# Altium footprint library xialeste-20221201.PcbLib: 195 footprints (part 4 of 13)
Each footprint in its own frame and in the unit in brackets; x right, y up, seen from the top. Pads: shape width x height; smd on the part's side, far side on the other; paste and mask are expansions set on the pad; w line width, h text height; cw(c..) or ccw(c..) is an arc to the next point about the centre after c.
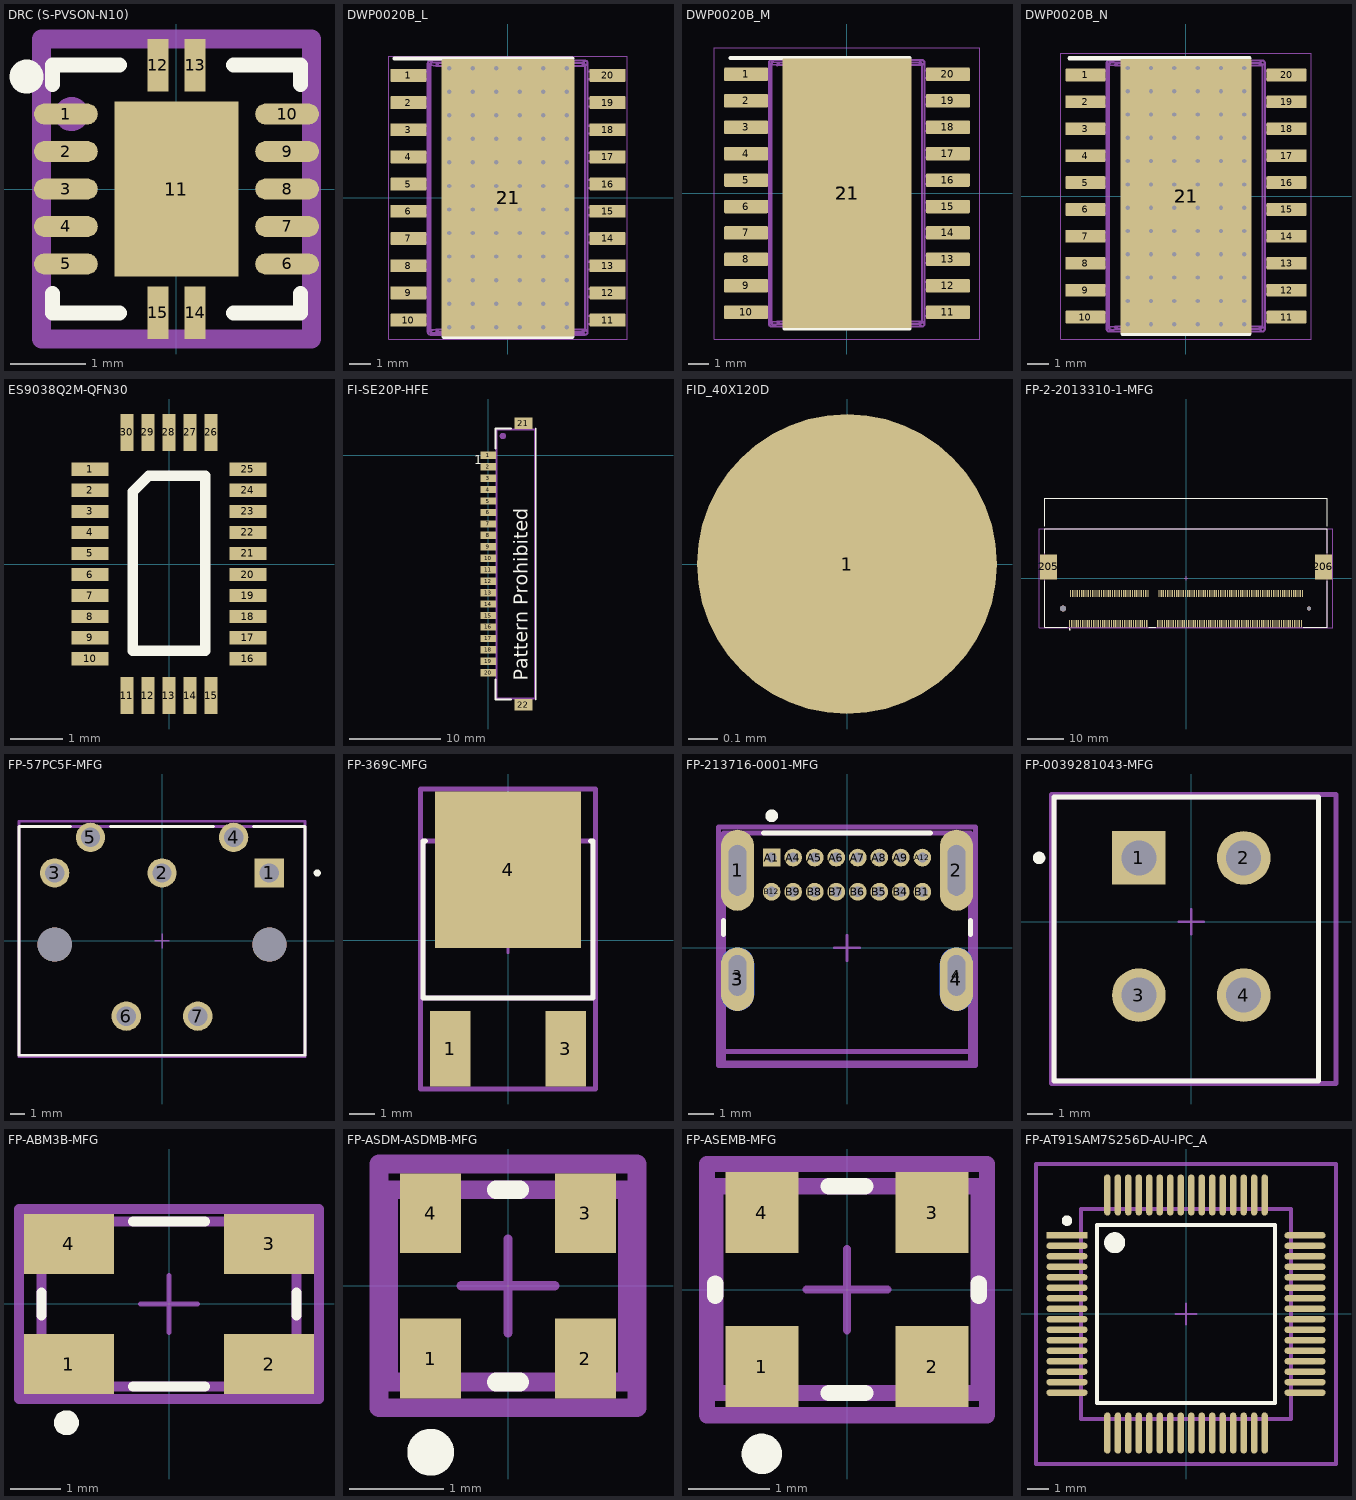
[diagram p3: the footprints below, top view; thin cyan lines are the x and y axes]

## DRC (S-PVSON-N10) [mm] "Creator MM"
pads (15):
  oval 0.85x0.28 smd mask+0.025: 1(-1.475,1) 2(-1.475,0.5) 3(-1.475,0) 4(-1.475,-0.5) 5(-1.475,-1) 6(1.475,-1) 7(1.475,-0.5) 8(1.475,0) 9(1.475,0.5) 10(1.475,1)
  rect 1.65x2.337 smd paste-1.524 mask+0.025: 11(0,0)
  rect 0.28x0.7 smd mask+0.127: 12(-0.25,1.651) 13(0.25,1.651) 14(0.25,-1.651) 15(-0.25,-1.651)
Top Overlay:
  circle w0.254: c-2,1.5 r0.1
  lines w0.2: -1.651,-1.397 -1.651,-1.651 -0.762,-1.651 ; -1.651,1.397 -1.651,1.651 -0.762,1.651 ; 0.762,-1.651 1.651,-1.651 1.651,-1.397 ; 0.762,1.651 1.651,1.651 1.651,1.397
Top Paste:
  rectangle: -0.762,0.101 -0.102,1.142
  rectangle: -0.762,-1.144 -0.102,-0.102
  rectangle: 0.101,-1.144 0.762,-0.102
  rectangle: 0.101,0.101 0.762,1.142
Mechanical 29:
  circle w0.254: c-1.4,1 r0.1
  lines w0.254: -1.8,-2 1.8,-2 1.8,2 -1.8,2 -1.8,-2
  text ".Designator" at 0.55,-0.9 h1
3D body: height 1, standoff 0, extent -1.651,-1.651 1.651,1.651

## DWP0020B_L [mm] "SOP, 20-Leads, Body 13x7.6mm, Pitch 1.27mm, Thermal Pad 2.79x3.81mm, IPC High Density"
height 2.65
pads (23):
  rrect17% 1.7x0.6 smd: 1(-4.65,5.715) 2(-4.65,4.445) 3(-4.65,3.175) 4(-4.65,1.905) 5(-4.65,0.635) 6(-4.65,-0.635) 7(-4.65,-1.905) 8(-4.65,-3.175) 9(-4.65,-4.445) 10(-4.65,-5.715) 11(4.65,-5.715) 12(4.65,-4.445) 13(4.65,-3.175) 14(4.65,-1.905) 15(4.65,-0.635) 16(4.65,0.635) 17(4.65,1.905) 18(4.65,3.175) 19(4.65,4.445) 20(4.65,5.715)
  rrect2% 6.2x12.95 smd paste-3.1 mask-3.1: 21(0,0)
  rrect4% 2.79x3.81 on Top Paste: 21(0,0)
  rrect4% 2.79x3.81 on Top Solder: 21(0,0)
via 2.75,-0.55 diameter 0.5 hole 0.2
via 1.65,-0.55 diameter 0.5 hole 0.2
via 0.55,-0.55 diameter 0.5 hole 0.2
via 0.55,-1.65 diameter 0.5 hole 0.2
via 1.65,-1.65 diameter 0.5 hole 0.2
via 2.75,-1.65 diameter 0.5 hole 0.2
via 0.55,-2.75 diameter 0.5 hole 0.2
via 1.65,-2.75 diameter 0.5 hole 0.2
via 2.75,-2.75 diameter 0.5 hole 0.2
via 0.55,-3.85 diameter 0.5 hole 0.2
via 1.65,-3.85 diameter 0.5 hole 0.2
via 2.75,-3.85 diameter 0.5 hole 0.2
via 0.55,-4.95 diameter 0.5 hole 0.2
via 1.65,-4.95 diameter 0.5 hole 0.2
via 2.75,-4.95 diameter 0.5 hole 0.2
via 0.55,-6.05 diameter 0.5 hole 0.2
via 1.65,-6.05 diameter 0.5 hole 0.2
via 2.75,-6.05 diameter 0.5 hole 0.2
via -2.75,-0.55 diameter 0.5 hole 0.2
via -1.65,-0.55 diameter 0.5 hole 0.2
via -0.55,-0.55 diameter 0.5 hole 0.2
via -0.55,-1.65 diameter 0.5 hole 0.2
via -1.65,-1.65 diameter 0.5 hole 0.2
via -2.75,-1.65 diameter 0.5 hole 0.2
via -0.55,-2.75 diameter 0.5 hole 0.2
via -1.65,-2.75 diameter 0.5 hole 0.2
via -2.75,-2.75 diameter 0.5 hole 0.2
via -0.55,-3.85 diameter 0.5 hole 0.2
via -1.65,-3.85 diameter 0.5 hole 0.2
via -2.75,-3.85 diameter 0.5 hole 0.2
via -0.55,-4.95 diameter 0.5 hole 0.2
via -1.65,-4.95 diameter 0.5 hole 0.2
via -2.75,-4.95 diameter 0.5 hole 0.2
via -0.55,-6.05 diameter 0.5 hole 0.2
via -1.65,-6.05 diameter 0.5 hole 0.2
via -2.75,-6.05 diameter 0.5 hole 0.2
via -2.75,0.55 diameter 0.5 hole 0.2
via -1.65,0.55 diameter 0.5 hole 0.2
via -0.55,0.55 diameter 0.5 hole 0.2
via -0.55,1.65 diameter 0.5 hole 0.2
via -1.65,1.65 diameter 0.5 hole 0.2
via -2.75,1.65 diameter 0.5 hole 0.2
via -0.55,2.75 diameter 0.5 hole 0.2
via -1.65,2.75 diameter 0.5 hole 0.2
via -2.75,2.75 diameter 0.5 hole 0.2
via -0.55,3.85 diameter 0.5 hole 0.2
via -1.65,3.85 diameter 0.5 hole 0.2
via -2.75,3.85 diameter 0.5 hole 0.2
via -0.55,4.95 diameter 0.5 hole 0.2
via -1.65,4.95 diameter 0.5 hole 0.2
via -2.75,4.95 diameter 0.5 hole 0.2
via -0.55,6.05 diameter 0.5 hole 0.2
via -1.65,6.05 diameter 0.5 hole 0.2
via -2.75,6.05 diameter 0.5 hole 0.2
via 2.75,6.05 diameter 0.5 hole 0.2
via 1.65,6.05 diameter 0.5 hole 0.2
via 0.55,6.05 diameter 0.5 hole 0.2
via 2.75,4.95 diameter 0.5 hole 0.2
via 1.65,4.95 diameter 0.5 hole 0.2
via 0.55,4.95 diameter 0.5 hole 0.2
via 2.75,3.85 diameter 0.5 hole 0.2
via 1.65,3.85 diameter 0.5 hole 0.2
via 0.55,3.85 diameter 0.5 hole 0.2
via 2.75,2.75 diameter 0.5 hole 0.2
via 1.65,2.75 diameter 0.5 hole 0.2
via 0.55,2.75 diameter 0.5 hole 0.2
via 2.75,1.65 diameter 0.5 hole 0.2
via 1.65,1.65 diameter 0.5 hole 0.2
via 0.55,1.65 diameter 0.5 hole 0.2
via 0.55,0.55 diameter 0.5 hole 0.2
via 1.65,0.55 diameter 0.5 hole 0.2
via 2.75,0.55 diameter 0.5 hole 0.2
Top Overlay:
  lines w0.2: -5.3,6.5 3,6.5 ; -3,-6.5 3,-6.5
Mechanical 1:
  text ".Designator" at -1.854,-0.508 h1.02
Top Assembly:
  drawing of 634 lines, arcs and shapes, not listed
Mechanical 15:
  lines w0.05: -5.575,-6.6 -5.575,6.6 5.575,6.6 5.575,-6.6 -5.575,-6.6
  lines w0.1: -0.5,0 0.5,0 -0.5,0 ; 0,-0.5 0,0.5 0,-0.5
3D body "DWP0020B.stp": height 2.65, standoff 0, extent -5.216,-6.412 5.216,6.413

## DWP0020B_M [mm] "SOP, 20-Leads, Body 13x7.6mm, Pitch 1.27mm, Thermal Pad 2.79x3.81mm, IPC Low Density"
height 2.65
pads (23):
  rrect15% 2.1x0.65 smd: 1(-4.85,5.715) 2(-4.85,4.445) 3(-4.85,3.175) 4(-4.85,1.905) 5(-4.85,0.635) 6(-4.85,-0.635) 7(-4.85,-1.905) 8(-4.85,-3.175) 9(-4.85,-4.445) 10(-4.85,-5.715) 11(4.85,-5.715) 12(4.85,-4.445) 13(4.85,-3.175) 14(4.85,-1.905) 15(4.85,-0.635) 16(4.85,0.635) 17(4.85,1.905) 18(4.85,3.175) 19(4.85,4.445) 20(4.85,5.715)
  rrect2% 6.2x12.95 smd paste-3.1 mask-3.1: 21(0,0)
  rrect4% 2.79x3.81 on Top Paste: 21(0,0)
  rrect4% 2.79x3.81 on Top Solder: 21(0,0)
Top Overlay:
  lines w0.2: -5.6,6.5 3,6.5 ; -3,-6.5 3,-6.5
Mechanical 1:
  text ".Designator" at -1.854,-0.508 h1.02
Top Assembly:
  drawing of 634 lines, arcs and shapes, not listed
Mechanical 15:
  lines w0.05: -6.375,-7 6.375,-7 6.375,7 -6.375,7 -6.375,-7
  lines w0.1: -0.5,0 0.5,0 -0.5,0 ; 0,-0.5 0,0.5 0,-0.5
3D body "DWP0020B.stp": height 2.65, standoff 0, extent -5.216,-6.412 5.216,6.413

## DWP0020B_N [mm] "SOP, 20-Leads, Body 13x7.6mm, Pitch 1.27mm, Thermal Pad 2.79x3.81mm, IPC Medium Density"
height 2.65
pads (23):
  rrect17% 1.9x0.6 smd: 1(-4.75,5.715) 2(-4.75,4.445) 3(-4.75,3.175) 4(-4.75,1.905) 5(-4.75,0.635) 6(-4.75,-0.635) 7(-4.75,-1.905) 8(-4.75,-3.175) 9(-4.75,-4.445) 10(-4.75,-5.715) 11(4.75,-5.715) 12(4.75,-4.445) 13(4.75,-3.175) 14(4.75,-1.905) 15(4.75,-0.635) 16(4.75,0.635) 17(4.75,1.905) 18(4.75,3.175) 19(4.75,4.445) 20(4.75,5.715)
  rrect2% 6.2x12.95 smd paste-3.1 mask-3.1: 21(0,0)
  rrect4% 2.79x3.81 on Top Paste: 21(0,0)
  rrect4% 2.79x3.81 on Top Solder: 21(0,0)
via 2.75,0.55 diameter 0.5 hole 0.2
via 1.65,0.55 diameter 0.5 hole 0.2
via 0.55,0.55 diameter 0.5 hole 0.2
via 0.55,1.65 diameter 0.5 hole 0.2
via 1.65,1.65 diameter 0.5 hole 0.2
via 2.75,1.65 diameter 0.5 hole 0.2
via 0.55,2.75 diameter 0.5 hole 0.2
via 1.65,2.75 diameter 0.5 hole 0.2
via 2.75,2.75 diameter 0.5 hole 0.2
via 0.55,3.85 diameter 0.5 hole 0.2
via 1.65,3.85 diameter 0.5 hole 0.2
via 2.75,3.85 diameter 0.5 hole 0.2
via 0.55,4.95 diameter 0.5 hole 0.2
via 1.65,4.95 diameter 0.5 hole 0.2
via 2.75,4.95 diameter 0.5 hole 0.2
via 0.55,6.05 diameter 0.5 hole 0.2
via 1.65,6.05 diameter 0.5 hole 0.2
via 2.75,6.05 diameter 0.5 hole 0.2
via -2.75,6.05 diameter 0.5 hole 0.2
via -1.65,6.05 diameter 0.5 hole 0.2
via -0.55,6.05 diameter 0.5 hole 0.2
via -2.75,4.95 diameter 0.5 hole 0.2
via -1.65,4.95 diameter 0.5 hole 0.2
via -0.55,4.95 diameter 0.5 hole 0.2
via -2.75,3.85 diameter 0.5 hole 0.2
via -1.65,3.85 diameter 0.5 hole 0.2
via -0.55,3.85 diameter 0.5 hole 0.2
via -2.75,2.75 diameter 0.5 hole 0.2
via -1.65,2.75 diameter 0.5 hole 0.2
via -0.55,2.75 diameter 0.5 hole 0.2
via -2.75,1.65 diameter 0.5 hole 0.2
via -1.65,1.65 diameter 0.5 hole 0.2
via -0.55,1.65 diameter 0.5 hole 0.2
via -0.55,0.55 diameter 0.5 hole 0.2
via -1.65,0.55 diameter 0.5 hole 0.2
via -2.75,0.55 diameter 0.5 hole 0.2
via -2.75,-6.05 diameter 0.5 hole 0.2
via -1.65,-6.05 diameter 0.5 hole 0.2
via -0.55,-6.05 diameter 0.5 hole 0.2
via -2.75,-4.95 diameter 0.5 hole 0.2
via -1.65,-4.95 diameter 0.5 hole 0.2
via -0.55,-4.95 diameter 0.5 hole 0.2
via -2.75,-3.85 diameter 0.5 hole 0.2
via -1.65,-3.85 diameter 0.5 hole 0.2
via -0.55,-3.85 diameter 0.5 hole 0.2
via -2.75,-2.75 diameter 0.5 hole 0.2
via -1.65,-2.75 diameter 0.5 hole 0.2
via -0.55,-2.75 diameter 0.5 hole 0.2
via -2.75,-1.65 diameter 0.5 hole 0.2
via -1.65,-1.65 diameter 0.5 hole 0.2
via -0.55,-1.65 diameter 0.5 hole 0.2
via -0.55,-0.55 diameter 0.5 hole 0.2
via -1.65,-0.55 diameter 0.5 hole 0.2
via -2.75,-0.55 diameter 0.5 hole 0.2
via 2.75,-6.05 diameter 0.5 hole 0.2
via 1.65,-6.05 diameter 0.5 hole 0.2
via 0.55,-6.05 diameter 0.5 hole 0.2
via 2.75,-4.95 diameter 0.5 hole 0.2
via 1.65,-4.95 diameter 0.5 hole 0.2
via 0.55,-4.95 diameter 0.5 hole 0.2
via 2.75,-3.85 diameter 0.5 hole 0.2
via 1.65,-3.85 diameter 0.5 hole 0.2
via 0.55,-3.85 diameter 0.5 hole 0.2
via 2.75,-2.75 diameter 0.5 hole 0.2
via 1.65,-2.75 diameter 0.5 hole 0.2
via 0.55,-2.75 diameter 0.5 hole 0.2
via 2.75,-1.65 diameter 0.5 hole 0.2
via 1.65,-1.65 diameter 0.5 hole 0.2
via 0.55,-1.65 diameter 0.5 hole 0.2
via 0.55,-0.55 diameter 0.5 hole 0.2
via 1.65,-0.55 diameter 0.5 hole 0.2
via 2.75,-0.55 diameter 0.5 hole 0.2
Top Overlay:
  lines w0.2: -5.5,6.5 3,6.5 ; -3,-6.5 3,-6.5
Mechanical 1:
  text ".Designator" at -1.854,-0.508 h1.02
Top Assembly:
  drawing of 634 lines, arcs and shapes, not listed
Mechanical 15:
  lines w0.05: -5.925,-6.75 5.925,-6.75 5.925,6.75 -5.925,6.75 -5.925,-6.75
  lines w0.1: -0.5,0 0.5,0 -0.5,0 ; 0,-0.5 0,0.5 0,-0.5
3D body "DWP0020B.stp": height 2.65, standoff 0, extent -5.216,-6.412 5.216,6.413

## ES9038Q2M-QFN30 [mm]
pads (30):
  rect 0.7x0.25 smd: 1(-1.5,1.8) 2(-1.5,1.4) 3(-1.5,1) 4(-1.5,0.6) 5(-1.5,0.2) 6(-1.5,-0.2) 7(-1.5,-0.6) 8(-1.5,-1) 9(-1.5,-1.4) 10(-1.5,-1.8) 16(1.5,-1.8) 17(1.5,-1.4) 18(1.5,-1) 19(1.5,-0.6) 20(1.5,-0.2) 21(1.5,0.2) 22(1.5,0.6) 23(1.5,1) 24(1.5,1.4) 25(1.5,1.8)
  rect 0.25x0.7 smd: 11(-0.8,-2.5) 12(-0.4,-2.5) 13(0,-2.5) 14(0.4,-2.5) 15(0.8,-2.5) 26(0.8,2.5) 27(0.4,2.5) 28(0,2.5) 29(-0.4,2.5) 30(-0.8,2.5)
Top Overlay:
  lines w0.2: -0.686,-1.651 0.686,-1.651 0.686,1.676 -0.384,1.676 -0.686,1.375 -0.686,-1.651

## FI-SE20P-HFE [mm] "Creator MM"
height 1.96
pads (22):
  rect 1.7x0.8 smd: 1(0,0) 2(0,-1.25) 3(0,-2.5) 4(0,-3.75) 5(0,-5) 6(0,-6.25) 7(0,-7.5) 8(0,-8.75) 9(0,-10) 10(0,-11.25) 11(0,-12.5) 12(0,-13.75) 13(0,-15) 14(0,-16.25) 15(0,-17.5) 16(0,-18.75) 17(0,-20) 18(0,-21.25) 19(0,-22.5) 20(0,-23.75)
  rect 2x1.25 smd: 21(3.85,3.5) 22(3.85,-27.25)
Top Overlay:
  lines w0.2: 0.8,-24.45 0.8,-26.65 2.5,-26.65 ; 0.8,0.7 0.8,2.9 2.5,2.9 ; 5.2,-26.65 5.2,2.9
  text "Pattern Prohibited" at 4.3,-24.6 h1.52
  text "1" at -1.5,-1 h1.02
Mechanical 29:
  circle w0.5: c1.6,2.1 r0.1
  lines w0.2: 0.9,-26.55 5.1,-26.55 5.1,2.8 0.9,2.8 0.9,-26.55
  text ".Designator" at 2.2,-10.5 h1.52
3D body "K3D-FI-SE20P-HFE-R1.STEP": height 2.11, standoff 0, extent -0.25,-27.275 5.1,3.475

## FID_40X120D [mil]
pads (1):
  round 40 smd paste-40 mask+40: 1(0,0)

## FP-2-2013310-1-MFG [mm]
pads (208):
  rect 0.35x2 smd paste+0 mask+0: 1(-31.65,-12.35) 2(-31.35,-4.15) 3(-31.05,-12.35) 4(-30.75,-4.15) 5(-30.45,-12.35) 6(-30.15,-4.15) 7(-29.85,-12.35) 8(-29.55,-4.15) 9(-29.25,-12.35) 10(-28.95,-4.15) 11(-28.65,-12.35) 12(-28.35,-4.15) 13(-28.05,-12.35) 14(-27.75,-4.15) 15(-27.45,-12.35) 16(-27.15,-4.15) 17(-26.85,-12.35) 18(-26.55,-4.15) 19(-26.25,-12.35) 20(-25.95,-4.15) 21(-25.65,-12.35) 22(-25.35,-4.15) 23(-25.05,-12.35) 24(-24.75,-4.15) 25(-24.45,-12.35) 26(-24.15,-4.15) 27(-23.85,-12.35) 28(-23.55,-4.15) 29(-23.25,-12.35) 30(-22.95,-4.15) 31(-22.65,-12.35) 32(-22.35,-4.15) 33(-22.05,-12.35) 34(-21.75,-4.15) 35(-21.45,-12.35) 36(-21.15,-4.15) 37(-20.85,-12.35) 38(-20.55,-4.15) 39(-20.25,-12.35) 40(-19.95,-4.15) 41(-19.65,-12.35) 42(-19.35,-4.15) 43(-19.05,-12.35) 44(-18.75,-4.15) 45(-18.45,-12.35) 46(-18.15,-4.15) 47(-17.85,-12.35) 48(-17.55,-4.15) 49(-17.25,-12.35) 50(-16.95,-4.15) 51(-16.65,-12.35) 52(-16.35,-4.15) 53(-16.05,-12.35) 54(-15.75,-4.15) 55(-15.45,-12.35) 56(-15.15,-4.15) 57(-14.85,-12.35) 58(-14.55,-4.15) 59(-14.25,-12.35) 60(-13.95,-4.15) 61(-13.65,-12.35) 62(-13.35,-4.15) 63(-13.05,-12.35) 64(-12.75,-4.15) 65(-12.45,-12.35) 66(-12.15,-4.15) 67(-11.85,-12.35) 68(-11.55,-4.15) 69(-11.25,-12.35) 70(-10.95,-4.15) 71(-10.65,-12.35) 72(-10.35,-4.15) 73(-7.65,-12.35) 74(-7.35,-4.15) 75(-7.05,-12.35) 76(-6.75,-4.15) 77(-6.45,-12.35) 78(-6.15,-4.15) 79(-5.85,-12.35) 80(-5.55,-4.15) 81(-5.25,-12.35) 82(-4.95,-4.15) 83(-4.65,-12.35) 84(-4.35,-4.15) 85(-4.05,-12.35) 86(-3.75,-4.15) 87(-3.45,-12.35) 88(-3.15,-4.15) 89(-2.85,-12.35) 90(-2.55,-4.15) 91(-2.25,-12.35) 92(-1.95,-4.15) 93(-1.65,-12.35) 94(-1.35,-4.15) 95(-1.05,-12.35) 96(-0.75,-4.15) 97(-0.45,-12.35) 98(-0.15,-4.15) 99(0.15,-12.35) 100(0.45,-4.15) 101(0.75,-12.35) 102(1.05,-4.15) 103(1.35,-12.35) 104(1.65,-4.15) 105(1.95,-12.35) 106(2.25,-4.15) 107(2.55,-12.35) 108(2.85,-4.15) 109(3.15,-12.35) 110(3.45,-4.15) 111(3.75,-12.35) 112(4.05,-4.15) 113(4.35,-12.35) 114(4.65,-4.15) 115(4.95,-12.35) 116(5.25,-4.15) 117(5.55,-12.35) 118(5.85,-4.15) 119(6.15,-12.35) 120(6.45,-4.15) 121(6.75,-12.35) 122(7.05,-4.15) 123(7.35,-12.35) 124(7.65,-4.15) 125(7.95,-12.35) 126(8.25,-4.15) 127(8.55,-12.35) 128(8.85,-4.15) 129(9.15,-12.35) 130(9.45,-4.15) 131(9.75,-12.35) 132(10.05,-4.15) 133(10.35,-12.35) 134(10.65,-4.15) 135(10.95,-12.35) 136(11.25,-4.15) 137(11.55,-12.35) 138(11.85,-4.15) 139(12.15,-12.35) 140(12.45,-4.15) 141(12.75,-12.35) 142(13.05,-4.15) 143(13.35,-12.35) 144(13.65,-4.15) 145(13.95,-12.35) 146(14.25,-4.15) 147(14.55,-12.35) 148(14.85,-4.15) 149(15.15,-12.35) 150(15.45,-4.15) 151(15.75,-12.35) 152(16.05,-4.15) 153(16.35,-12.35) 154(16.65,-4.15) 155(16.95,-12.35) 156(17.25,-4.15) 157(17.55,-12.35) 158(17.85,-4.15) 159(18.15,-12.35) 160(18.45,-4.15) 161(18.75,-12.35) 162(19.05,-4.15) 163(19.35,-12.35) 164(19.65,-4.15) 165(19.95,-12.35) 166(20.25,-4.15) 167(20.55,-12.35) 168(20.85,-4.15) 169(21.15,-12.35) 170(21.45,-4.15) 171(21.75,-12.35) 172(22.05,-4.15) 173(22.35,-12.35) 174(22.65,-4.15) 175(22.95,-12.35) 176(23.25,-4.15) 177(23.55,-12.35) 178(23.85,-4.15) 179(24.15,-12.35) 180(24.45,-4.15) 181(24.75,-12.35) 182(25.05,-4.15) 183(25.35,-12.35) 184(25.65,-4.15) 185(25.95,-12.35) 186(26.25,-4.15) 187(26.55,-12.35) 188(26.85,-4.15) 189(27.15,-12.35) 190(27.45,-4.15) 191(27.75,-12.35) 192(28.05,-4.15) 193(28.35,-12.35) 194(28.65,-4.15) 195(28.95,-12.35) 196(29.25,-4.15) 197(29.55,-12.35) 198(29.85,-4.15) 199(30.15,-12.35) 200(30.45,-4.15) 201(30.75,-12.35) 202(31.05,-4.15) 203(31.35,-12.35) 204(31.65,-4.15)
  rect 4.7x6.8 smd paste+0 mask+0: 205(-37.35,3.05) 206(37.35,3.05)
  round 1.6 hole 1.6 unplated paste-1000 mask+0: ""(-33.4,-8.25)
  round 1.1 hole 1.1 unplated paste-1000 mask+0: ""(33.4,-8.25)
Top Overlay:
  circle w0.25: c-31.625,-13.925 r0.125
  lines w0.2: -38.4,-0.725 -38.4,-13.375 -32.2,-13.375 ; -38.4,6.825 -38.4,13.375 38.4,13.375 38.4,6.825 ; -38.4,14.143 -38.4,21.75 38.4,21.75 38.4,14.143 ; -10.1,-13.375 -8.2,-13.375 ; 31.9,-13.375 38.4,-13.375 38.4,-0.725
Top 3D Body:
  lines w0.2: -38.4,-13.375 -38.4,13.375 38.4,13.375 38.4,-13.375 -38.4,-13.375
Top Courtyard:
  lines w0.2: -39.8,-13.475 -39.8,13.475 39.8,13.475 39.8,-13.475 -39.8,-13.475
Top Assembly:
  lines w0.2: -39.8,-13.475 -39.8,13.475 39.8,13.475 39.8,-13.475 -39.8,-13.475
  text ".Designator" at 0,0.187 h1
Top Component Center:
  lines w0.1: -0.5,0 0.5,0 ; 0,-0.5 0,0.5
3D body "Conn_TE_Connectivity_2-2013310-1_eec.STEP": height 0.25, standoff 0, extent -39.8,-13.475 39.8,13.475

## FP-57PC5F-MFG [mm]
pads (9):
  rect 2.05x2.05 hole 1.35 paste-1000 mask+0: 1(7.505,4.75)
  round 2.05 hole 1.35 paste-1000 mask+0: 2(0,4.75) 3(-7.505,4.75) 4(5.005,7.24) 5(-5.005,7.24) 6(-2.5,-5.26) 7(2.5,-5.26)
  round 2.39 hole 2.39 unplated paste-1000 mask+0: ""(-7.505,-0.26) ""(7.505,-0.26)
Top Overlay:
  circle w0.25: c10.85,4.75 r0.125
  lines w0.2: -6.405,8 -10,8 -10,-8 10,-8 10,8 6.405,8 ; -3.605,8 3.605,8
Top 3D Body:
  lines w0.2: -10,-8 -10,8 10,8 10,-8 -10,-8
Top Courtyard:
  lines w0.2: -10,-8.1 -10,8.365 10,8.365 10,-8.1 -10,-8.1
Top Assembly:
  lines w0.2: -10,-8.1 -10,8.365 10,8.365 10,-8.1 -10,-8.1
  text ".Designator" at 0,0.32 h1
Top Component Center:
  lines w0.1: -0.5,0 0.5,0 ; 0,-0.5 0,0.5
3D body "Conn_Switchcraft_57PC5F_eec.STEP": height 0.25, standoff 0, extent -10.35,-8.1 10.35,8.365

## FP-369C-MFG [mm]
pads (3):
  rect 1.6x3 smd paste+0 mask+0: 1(-2.285,-4.3) 3(2.285,-4.3)
  rect 5.8x6.2 smd paste+0 mask+0: 4(0,2.79)
Top Overlay:
  lines w0.2: -3.275,3.935 -3.365,3.935 -3.365,-2.285 3.365,-2.285 3.365,3.935 3.275,3.935
Top 3D Body:
  lines w0.2: -3.365,-2.285 3.365,-2.285 3.365,3.935 -3.365,3.935 -3.365,-2.285
Top Courtyard:
  lines w0.2: -3.465,-5.9 3.465,-5.9 3.465,5.99 -3.465,5.99 -3.465,-5.9
Top Assembly:
  lines w0.2: -3.465,-5.9 3.465,-5.9 3.465,5.99 -3.465,5.99 -3.465,-5.9
  text ".Designator" at 0,0.044 h1
Top Component Center:
  lines w0.1: -0.5,0 0.5,0 ; 0,-0.5 0,0.5
3D body "IC_ON_Semiconductor_MC7805CDTG_eec.STEP": height 0.25, standoff 0, extent -3.465,-5.9 3.465,5.99

## FP-213716-0001-MFG [mm]
pads (24):
  rrect100% 1.3x3.2 hole 2 slot 0.7 at 0 deg paste-1000 mask+0: 1(-4.32,3.065) 2(4.32,3.065)
  rrect100% 1.3x2.5 smd paste-1000 mask+0: 3(-4.32,-1.235) 4(4.32,-1.235)
  rrect100% 1.3x2.5 smd far side paste-1000 mask+0: 3(-4.32,-1.235) 4(4.32,-1.235)
  rrect100% 0.7x1.6 hole 1.6 slot 0.7 at 0 deg paste-1000 mask+0: 3(-4.32,-1.085) 4(4.32,-1.085)
  rect 0.7x0.7 hole 0.4 paste-1000 mask+0: A1(-2.975,3.565)
  round 0.7 hole 0.4 paste-1000 mask+0: A4(-2.125,3.565) A5(-1.275,3.565) A6(-0.425,3.565) A7(0.425,3.565) A8(1.275,3.565) A9(2.125,3.565) A12(2.975,3.565) B1(2.975,2.215) B4(2.125,2.215) B5(1.275,2.215) B6(0.425,2.215) B7(-0.425,2.215) B8(-1.275,2.215) B9(-2.125,2.215) B12(-2.975,2.215)
Top Overlay:
  circle w0.25: c-2.975,5.215 r0.125
  lines w0.2: -4.87,0.54 -4.87,1.09 ; -3.295,4.535 3.295,4.535 ; 4.87,0.54 4.87,1.09
Top 3D Body:
  lines w0.2: -5.07,-4.085 5.07,-4.085 ; -4.87,-4.535 -4.87,4.535 4.87,4.535 4.87,-4.535 -4.87,-4.535
Top Courtyard:
  lines w0.2: -5.07,-4.635 -5.07,4.765 5.07,4.765 5.07,-4.635 -5.07,-4.635
Top Assembly:
  lines w0.2: -5.07,-4.635 -5.07,4.765 5.07,4.765 5.07,-4.635 -5.07,-4.635
  text ".Designator" at 0,0.252 h1
Top Component Center:
  lines w0.1: -0.5,0 0.5,0 ; 0,-0.5 0,0.5
3D body "Conn_Molex_213716-0001_eec.STEP": height 0.25, standoff 0, extent -5.07,-4.635 5.07,4.765

## FP-0039281043-MFG [mm]
pads (4):
  rect 2.15x2.15 hole 1.4 paste-1000 mask+0: 1(-2.1,2.55)
  round 2.15 hole 1.4 paste-1000 mask+0: 2(2.1,2.55) 3(-2.1,-2.95) 4(2.1,-2.95)
Top Overlay:
  circle w0.25: c-6.1,2.55 r0.125
  lines w0.2: -5.5,-6.4 5.1,-6.4 5.1,5 -5.5,5 -5.5,-6.4
Top 3D Body:
  lines w0.2: -5.5,-6.4 5.1,-6.4 5.1,5 -5.5,5 -5.5,-6.4
Top Courtyard:
  lines w0.2: -5.6,-6.5 5.8,-6.5 5.8,5.1 -5.6,5.1 -5.6,-6.5
Top Assembly:
  lines w0.2: -5.6,-6.5 5.8,-6.5 5.8,5.1 -5.6,5.1 -5.6,-6.5
  text ".Designator" at 0.1,-0.513 h1
Top Component Center:
  lines w0.1: -0.5,0 0.5,0 ; 0,-0.5 0,0.5
3D body "Conn_Molex_0039281043_eec.STEP": height 0.25, standoff 0, extent -5.6,-6.5 5.8,5.1

## FP-ABM3B-MFG [mm]
pads (4):
  rect 1.8x1.2 smd paste+0 mask+0: 1(-2,-1.2) 2(2,-1.2) 3(2,1.2) 4(-2,1.2)
Top Overlay:
  circle w0.25: c-2.05,-2.375 r0.125
  lines w0.2: -2.55,-0.225 -2.55,0.225 ; -0.725,-1.65 0.725,-1.65 ; -0.725,1.65 0.725,1.65 ; 2.55,-0.225 2.55,0.225
Top 3D Body:
  lines w0.2: -2.55,-1.65 2.55,-1.65 2.55,1.65 -2.55,1.65 -2.55,-1.65
Top Courtyard:
  lines w0.2: -3,-1.9 3,-1.9 3,1.9 -3,1.9 -3,-1.9
Top Assembly:
  lines w0.2: -3,-1.9 3,-1.9 3,1.9 -3,1.9 -3,-1.9
  text ".Designator" at 0,0.187 h1
Top Component Center:
  lines w0.1: -0.57,0 0.57,0 ; 0,-0.57 0,0.57
3D body "Crys_Abracon_ABM3B-12_000MHZ-10-B-1-U-T_eec.STEP": height 0.25, standoff 0, extent -3,-1.9 3,1.9

## FP-ASDM-ASDMB-MFG [mm]
pads (4):
  rect 0.65x0.85 smd paste+0 mask+0: 1(-0.825,-0.775) 2(0.825,-0.775) 3(0.825,0.775) 4(-0.825,0.775)
Top Overlay:
  circle w0.25: c-0.825,-1.775 r0.125
  lines w0.2: -0.125,-1.025 0.125,-1.025 ; -0.125,1.025 0.125,1.025
Top 3D Body:
  lines w0.2: -1.275,-1.025 -1.275,1.025 1.275,1.025 1.275,-1.025 -1.275,-1.025
Top Courtyard:
  lines w0.2: -1.375,-1.3 -1.375,1.3 1.375,1.3 1.375,-1.3 -1.375,-1.3
Top Assembly:
  lines w0.2: -1.375,-1.3 -1.375,1.3 1.375,1.3 1.375,-1.3 -1.375,-1.3
  text ".Designator" at 0,0.187 h1
Top Component Center:
  lines w0.1: -0.5,0 0.5,0 ; 0,-0.5 0,0.5
3D body "Crys_Abracon_ASDMB-80_000MHZ-XY-T_eec.STEP": height 0.25, standoff 0, extent -1.375,-1.3 1.375,1.3

## FP-ASEMB-MFG [mm]
pads (4):
  rect 0.9x1 smd paste+0 mask+0: 1(-1.05,-0.95) 2(1.05,-0.95) 3(1.05,0.95) 4(-1.05,0.95)
Top Overlay:
  circle w0.25: c-1.05,-2.025 r0.125
  lines w0.2: -1.625,-0.075 -1.625,0.075 ; -0.225,-1.275 0.225,-1.275 ; -0.225,1.275 0.225,1.275 ; 1.625,-0.075 1.625,0.075
Top 3D Body:
  lines w0.2: -1.625,-1.275 1.625,-1.275 1.625,1.275 -1.625,1.275 -1.625,-1.275
Top Courtyard:
  lines w0.2: -1.725,-1.55 1.725,-1.55 1.725,1.55 -1.725,1.55 -1.725,-1.55
Top Assembly:
  lines w0.2: -1.725,-1.55 1.725,-1.55 1.725,1.55 -1.725,1.55 -1.725,-1.55
  text ".Designator" at 0,0.187 h1
Top Component Center:
  lines w0.1: -0.5,0 0.5,0 ; 0,-0.5 0,0.5
3D body "Crys_Abracon_ASEMB-25_000MHZ-LC-T_eec.STEP": height 0.25, standoff 0, extent -1.725,-1.55 1.725,1.55

## FP-AT91SAM7S256D-AU-IPC_A [mm]
pads (64):
  rect 1.955x0.312 smd paste+0 mask+0: 1(-5.675,3.75)
  rrect100% 1.955x0.312 smd paste+0 mask+0: 2(-5.675,3.25) 3(-5.675,2.75) 4(-5.675,2.25) 5(-5.675,1.75) 6(-5.675,1.25) 7(-5.675,0.75) 8(-5.675,0.25) 9(-5.675,-0.25) 10(-5.675,-0.75) 11(-5.675,-1.25) 12(-5.675,-1.75) 13(-5.675,-2.25) 14(-5.675,-2.75) 15(-5.675,-3.25) 16(-5.675,-3.75) 33(5.675,-3.75) 34(5.675,-3.25) 35(5.675,-2.75) 36(5.675,-2.25) 37(5.675,-1.75) 38(5.675,-1.25) 39(5.675,-0.75) 40(5.675,-0.25) 41(5.675,0.25) 42(5.675,0.75) 43(5.675,1.25) 44(5.675,1.75) 45(5.675,2.25) 46(5.675,2.75) 47(5.675,3.25) 48(5.675,3.75)
  rrect100% 0.312x1.955 smd paste+0 mask+0: 17(-3.75,-5.675) 18(-3.25,-5.675) 19(-2.75,-5.675) 20(-2.25,-5.675) 21(-1.75,-5.675) 22(-1.25,-5.675) 23(-0.75,-5.675) 24(-0.25,-5.675) 25(0.25,-5.675) 26(0.75,-5.675) 27(1.25,-5.675) 28(1.75,-5.675) 29(2.25,-5.675) 30(2.75,-5.675) 31(3.25,-5.675) 32(3.75,-5.675) 49(3.75,5.675) 50(3.25,5.675) 51(2.75,5.675) 52(2.25,5.675) 53(1.75,5.675) 54(1.25,5.675) 55(0.75,5.675) 56(0.25,5.675) 57(-0.25,5.675) 58(-0.75,5.675) 59(-1.25,5.675) 60(-1.75,5.675) 61(-2.25,5.675) 62(-2.75,5.675) 63(-3.25,5.675) 64(-3.75,5.675)
Top Overlay:
  circle w0.25: c-5.675,4.45 r0.125
  circle w0.5: c-3.4,3.4 r0.25
  lines w0.2: -4.25,-4.25 4.25,-4.25 4.25,4.25 -4.25,4.25 -4.25,-4.25
Top 3D Body:
  lines w0.2: -5,-5 5,-5 5,5 -5,5 -5,-5
Top Courtyard:
  lines w0.2: -7.153,-7.153 7.153,-7.153 7.153,7.153 -7.153,7.153 -7.153,-7.153
Top Assembly:
  lines w0.2: -7.153,-7.153 7.153,-7.153 7.153,7.153 -7.153,7.153 -7.153,-7.153
  text ".Designator" at 0,-0.001 h1
Top Component Center:
  lines w0.1: -0.5,0 0.5,0 ; 0,-0.5 0,0.5
3D body "IC_Microchip_AT91SAM7S256D-AU_eec.STEP": height 0.25, standoff 0, extent -7.153,-7.153 7.153,7.153